# Altium footprint library Pedro_pcb_lib.PcbLib: 35 footprints (part 2 of 3)
Each footprint in its own frame and in the unit in brackets; x right, y up, seen from the top. Pads: shape width x height; smd on the part's side, far side on the other; paste and mask are expansions set on the pad; w line width, h text height; cw(c..) or ccw(c..) is an arc to the next point about the centre after c.
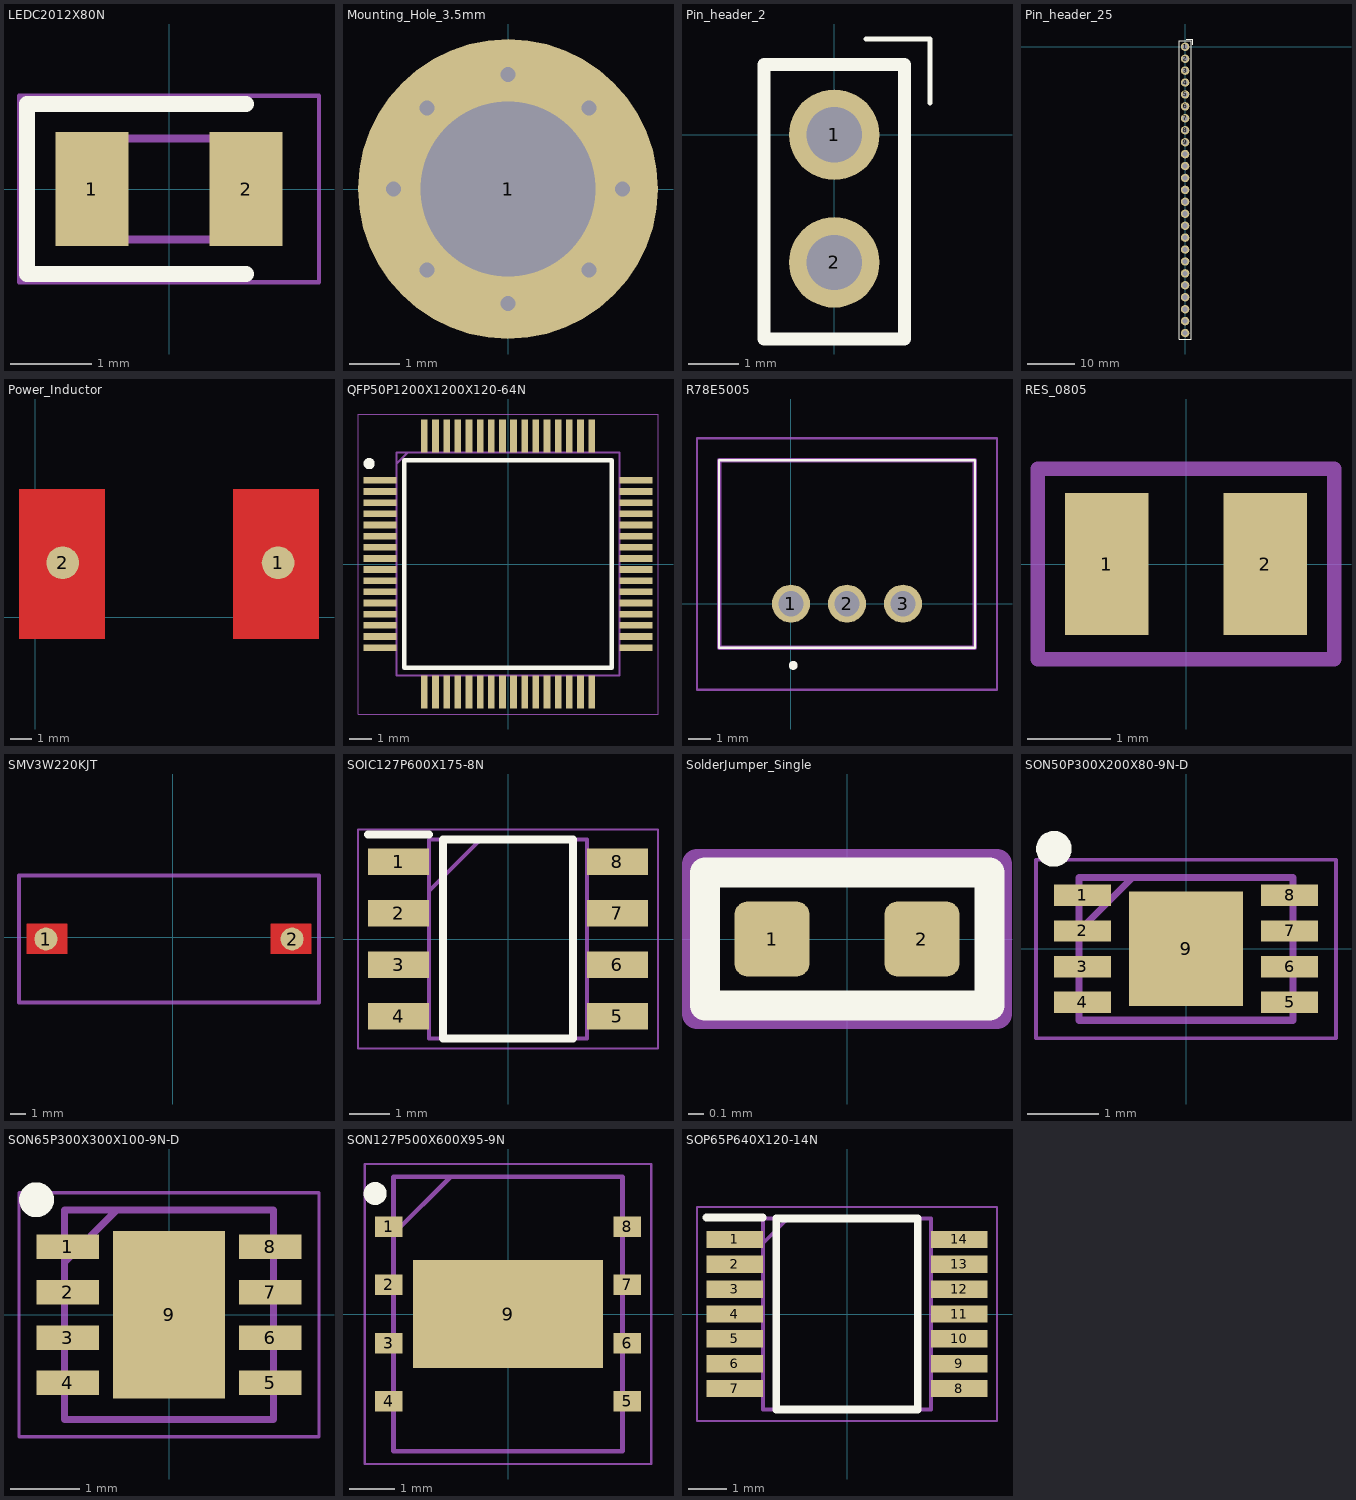
[diagram p1: the footprints below, top view; thin cyan lines are the x and y axes]

## LEDC2012X80N [mm]
pads (2):
  rect 0.9x1.4 smd: 1(-0.95,0) 2(0.95,0)
Top Overlay:
  lines w0.2: 0.95,-1.05 -1.75,-1.05 -1.75,1.05 0.95,1.05
Mechanical 13:
  lines w0.1: -1,0.208 -0.583,0.625 ; -1,-0.625 -1,0.625 1,0.625 1,-0.625 -1,-0.625
Mechanical 15:
  lines w0.05: -1.85,-1.15 -1.85,1.15 1.85,1.15 1.85,-1.15 -1.85,-1.15
3D body "150080BS75000.stp": height 0.7, standoff 0, extent -1.03,-0.625 0.97,0.625

## Mounting_Hole_3.5mm [mm]
pads (1):
  round 6 hole 3.5: 1(0,0)
via 0,2.286 diameter 0.5 hole 0.3
via -1.616,1.616 diameter 0.5 hole 0.3
via -2.286,0 diameter 0.5 hole 0.3
via -1.616,-1.616 diameter 0.5 hole 0.3
via 0,-2.286 diameter 0.5 hole 0.3
via 1.616,-1.616 diameter 0.5 hole 0.3
via 2.286,0 diameter 0.5 hole 0.3
via 1.616,1.616 diameter 0.5 hole 0.3

## nvme hole [mm]

## Pin_header_2 [mm]
pads (2):
  round 1.8 hole 1.1 mask+0.07: 1(0,0) 2(0,-2.54)
Top Overlay:
  lines w0.1: 0.635,1.905 1.905,1.905 1.905,0.635
  lines w0.254: -1.397,-4.064 1.397,-4.064 1.397,1.397 -1.397,1.397 -1.397,-4.064

## Pin_header_25 [mm]
pads (25):
  round 1.8 hole 1.1 mask+0.07: 1(0,0) 2(0,-2.54) 3(0,-5.08) 4(0,-7.62) 5(0,-10.16) 6(0,-12.7) 7(0,-15.24) 8(0,-17.78) 9(0,-20.32) 10(0,-22.86) 11(0,-25.4) 12(0,-27.94) 13(0,-30.48) 14(0,-33.02) 15(0,-35.56) 16(0,-38.1) 17(0,-40.64) 18(0,-43.18) 19(0,-45.72) 20(0,-48.26) 21(0,-50.8) 22(0,-53.34) 23(0,-55.88) 24(0,-58.42) 25(0,-60.96)
Top Overlay:
  lines w0.1: 0.254,1.651 1.651,1.651 1.651,0.381
  lines w0.254: -1.27,-62.23 1.27,-62.23 1.27,1.27 -1.27,1.27 -1.27,-62.23

## Power_Inductor [mil]
pads (2):
  round 60 smd mask+0: 1(445,100) 2(50,100)
Top Layer:
  rectangle: -30,-40 127.48,235.59
  rectangle: 362.52,-40 520,235.59
  rectangle: -30,-40 127.48,235.59
3D body "1625812-4--3DModel-STEP-1.STEP": height 236.22, standoff 0, extent -5,-155 495,345

## QFP50P1200X1200X120-64N [mm]
pads (64):
  rect 1.475x0.3 smd: 1(-5.738,3.75) 2(-5.738,3.25) 3(-5.738,2.75) 4(-5.738,2.25) 5(-5.738,1.75) 6(-5.738,1.25) 7(-5.738,0.75) 8(-5.738,0.25) 9(-5.738,-0.25) 10(-5.738,-0.75) 11(-5.738,-1.25) 12(-5.738,-1.75) 13(-5.738,-2.25) 14(-5.738,-2.75) 15(-5.738,-3.25) 16(-5.738,-3.75) 33(5.738,-3.75) 34(5.738,-3.25) 35(5.738,-2.75) 36(5.738,-2.25) 37(5.738,-1.75) 38(5.738,-1.25) 39(5.738,-0.75) 40(5.738,-0.25) 41(5.738,0.25) 42(5.738,0.75) 43(5.738,1.25) 44(5.738,1.75) 45(5.738,2.25) 46(5.738,2.75) 47(5.738,3.25) 48(5.738,3.75)
  rect 0.3x1.475 smd: 17(-3.75,-5.738) 18(-3.25,-5.738) 19(-2.75,-5.738) 20(-2.25,-5.738) 21(-1.75,-5.738) 22(-1.25,-5.738) 23(-0.75,-5.738) 24(-0.25,-5.738) 25(0.25,-5.738) 26(0.75,-5.738) 27(1.25,-5.738) 28(1.75,-5.738) 29(2.25,-5.738) 30(2.75,-5.738) 31(3.25,-5.738) 32(3.75,-5.738) 49(3.75,5.738) 50(3.25,5.738) 51(2.75,5.738) 52(2.25,5.738) 53(1.75,5.738) 54(1.25,5.738) 55(0.75,5.738) 56(0.25,5.738) 57(-0.25,5.738) 58(-0.75,5.738) 59(-1.25,5.738) 60(-1.75,5.738) 61(-2.25,5.738) 62(-2.75,5.738) 63(-3.25,5.738) 64(-3.75,5.738)
Top Overlay:
  circle w0.25: c-6.225,4.5 r0.125
  lines w0.2: -4.65,-4.65 -4.65,4.65 4.65,4.65 4.65,-4.65 -4.65,-4.65
Mechanical 13:
  lines w0.1: -5,4.5 -4.5,5 ; -5,-5 -5,5 5,5 5,-5 -5,-5
Mechanical 15:
  lines w0.05: -6.725,-6.725 -6.725,6.725 6.725,6.725 6.725,-6.725 -6.725,-6.725
3D body "PIC32MK1024MCM064-I_PT.stp": height 1.2, standoff 0, extent -6,-6 6,6

## R78E5005 [mm]
pads (3):
  round 1.725 hole 1.15: 1(0,0) 2(2.54,0) 3(5.08,0)
Top Overlay:
  lines w0.1: -3.26,-2 8.34,-2 8.34,6.5 -3.26,6.5 -3.26,-2
  lines w0.2: 0,-2.8 ccw(c0.1,-2.8) 0.2,-2.8 ccw(c0.1,-2.8) 0,-2.8
Mechanical 13:
  lines w0.2: -3.26,-2 8.34,-2 8.34,6.5 -3.26,6.5 -3.26,-2
Mechanical 15:
  lines w0.1: -4.26,-3.9 9.34,-3.9 ; -4.26,-3.9 -4.26,7.5 ; -4.26,-3.9 9.34,-3.9 ; -4.26,-3.9 -4.26,7.5 ; -4.26,7.5 9.34,7.5 ; -4.26,7.5 9.34,7.5 ; 9.34,-3.9 9.34,7.5 ; 9.34,-3.9 9.34,7.5
3D body "R-78E5.0-0.5.stp": height 10.86, standoff -3.64, extent -3.345,-1.969 8.255,6.541

## RES_0805 [mm]
pads (2):
  rect 1x1.7 smd: 1(-0.95,0) 2(0.95,0)
Mechanical 13:
  lines w0.175: -1.778,-1.143 1.778,-1.143 1.778,1.143 -1.778,1.143 -1.778,-1.143
  text "'.Designator'" at -5.665,-0.417 h1
3D body "R0805.step": height 0.47, standoff 0.01, extent -1,-0.63 1,0.63

## SMV3W220KJT [mil]
pads (2):
  round 60 smd: 1(-330,-5) 2(310,-5)
Top Layer:
  region: -273.7,-43.74 -273.7,35 -380,35 -380,-43.74
  region: 360,-43.74 360,35 253.7,35 253.7,-43.74
Top Solder:
  region: -269.06,-49.4 -269.06,39.34 -385.36,39.34 -385.36,-49.4
  region: 365,-48.74 365,40 248.7,40 248.7,-48.74
Mechanical 13:
  lines w10: -400,-170 380,-170 380,160 -400,160 -400,-170
  text "'.Designator'" at -223.03,-16.4 h39.37
3D body "2176324-5.stp": height 267.72, standoff 0, extent -344.65,-148.7 324.65,138.7

## SOIC127P600X175-8N [mm]
pads (8):
  rect 1.5x0.65 smd: 1(-2.7,1.905) 2(-2.7,0.635) 3(-2.7,-0.635) 4(-2.7,-1.905) 5(2.7,-1.905) 6(2.7,-0.635) 7(2.7,0.635) 8(2.7,1.905)
Top Overlay:
  lines w0.2: -3.45,2.58 -1.95,2.58 ; -1.6,-2.45 -1.6,2.45 1.6,2.45 1.6,-2.45 -1.6,-2.45
Mechanical 13:
  lines w0.1: -1.95,1.18 -0.68,2.45 ; -1.95,-2.45 -1.95,2.45 1.95,2.45 1.95,-2.45 -1.95,-2.45
Mechanical 15:
  lines w0.05: -3.7,-2.7 -3.7,2.7 3.7,2.7 3.7,-2.7 -3.7,-2.7
3D body "MCP1405-E_SN.stp": height 1.75, standoff 0, extent -3,-2.45 3,2.45

## SolderJumper_Single [mm]
pads (2):
  rrect35% 0.5x0.5 smd mask+0: 1(-0.5,0) 2(0.5,0)
Top Overlay:
  lines w0.2: -0.948,-0.444 -0.948,0.048 -0.948,0.444 0.95,0.444 0.95,-0.444 -0.948,-0.444
Top Solder:
  region: -0.5,0.25 0.5,0.25 0.5,-0.25 -0.5,-0.25
Mechanical 13:
  lines w0.2: -1,-0.5 1,-0.5 1,0.5 -1,0.5 -1,-0.5
  text "'.Designator'" at -5.84,-0.925 h1

## SON50P300X200X80-9N-D [mm]
pads (9):
  rect 0.8x0.3 smd: 1(-1.45,0.75) 2(-1.45,0.25) 3(-1.45,-0.25) 4(-1.45,-0.75) 5(1.45,-0.75) 6(1.45,-0.25) 7(1.45,0.25) 8(1.45,0.75)
  rect 1.6x1.6 smd: 9(0,0)
Top Overlay:
  circle w0.25: c-1.85,1.4 r0.125
Mechanical 13:
  lines w0.1: -1.5,0.25 -0.75,1 ; -1.5,-1 -1.5,1 1.5,1 1.5,-1 -1.5,-1
Mechanical 15:
  lines w0.05: -2.1,-1.25 -2.1,1.25 2.1,1.25 2.1,-1.25 -2.1,-1.25
3D body "MCP16311T-E_MNY.stp": height 0.8, standoff 0, extent -1.55,-1 1.55,1

## SON65P300X300X100-9N-D [mm]
pads (9):
  rect 0.9x0.35 smd: 1(-1.45,0.975) 2(-1.45,0.325) 3(-1.45,-0.325) 4(-1.45,-0.975) 5(1.45,-0.975) 6(1.45,-0.325) 7(1.45,0.325) 8(1.45,0.975)
  rect 1.6x2.4 smd: 9(0,0)
Top Overlay:
  circle w0.25: c-1.9,1.65 r0.125
Mechanical 13:
  lines w0.1: -1.5,0.75 -0.75,1.5 ; -1.5,-1.5 -1.5,1.5 1.5,1.5 1.5,-1.5 -1.5,-1.5
Mechanical 15:
  lines w0.05: -2.15,-1.75 -2.15,1.75 2.15,1.75 2.15,-1.75 -2.15,-1.75
3D body "MCP2542FD-E_MF.stp": height 1, standoff 0, extent -1.55,-1.5 1.55,1.5

## SON127P500X600X95-9N [mm]
pads (9):
  rect 0.6x0.45 smd: 1(-2.6,1.905) 2(-2.6,0.635) 3(-2.6,-0.635) 4(-2.6,-1.905) 5(2.6,-1.905) 6(2.6,-0.635) 7(2.6,0.635) 8(2.6,1.905)
  rect 4.15x2.35 smd: 9(0,0)
Top Overlay:
  circle w0.25: c-2.9,2.63 r0.125
Mechanical 13:
  lines w0.1: -2.5,1.75 -1.25,3 ; -2.5,-3 -2.5,3 2.5,3 2.5,-3 -2.5,-3
Mechanical 15:
  lines w0.05: -3.125,-3.275 -3.125,3.275 3.125,3.275 3.125,-3.275 -3.125,-3.275
3D body "TC4420EMF.stp": height 0.95, standoff 0, extent -2.55,-3 2.55,3

## SOP65P640X120-14N [mm]
pads (14):
  rect 1.475x0.45 smd: 1(-2.938,1.95) 2(-2.938,1.3) 3(-2.938,0.65) 4(-2.938,0) 5(-2.938,-0.65) 6(-2.938,-1.3) 7(-2.938,-1.95) 8(2.938,-1.95) 9(2.938,-1.3) 10(2.938,-0.65) 11(2.938,0) 12(2.938,0.65) 13(2.938,1.3) 14(2.938,1.95)
Top Overlay:
  lines w0.2: -3.675,2.525 -2.2,2.525 ; -1.85,-2.5 -1.85,2.5 1.85,2.5 1.85,-2.5 -1.85,-2.5
Mechanical 13:
  lines w0.1: -2.2,1.85 -1.55,2.5 ; -2.2,-2.5 -2.2,2.5 2.2,2.5 2.2,-2.5 -2.2,-2.5
Mechanical 15:
  lines w0.05: -3.925,-2.8 -3.925,2.8 3.925,2.8 3.925,-2.8 -3.925,-2.8
3D body "MCP2221A-I_ST.stp": height 1.2, standoff 0, extent -3.2,-2.5 3.2,2.5